# Altium footprint library LION.PcbLib: 90 footprints (part 9 of 13)
Each footprint in its own frame and in the unit in brackets; x right, y up, seen from the top. Pads: shape width x height; smd on the part's side, far side on the other; paste and mask are expansions set on the pad; w line width, h text height; cw(c..) or ccw(c..) is an arc to the next point about the centre after c.
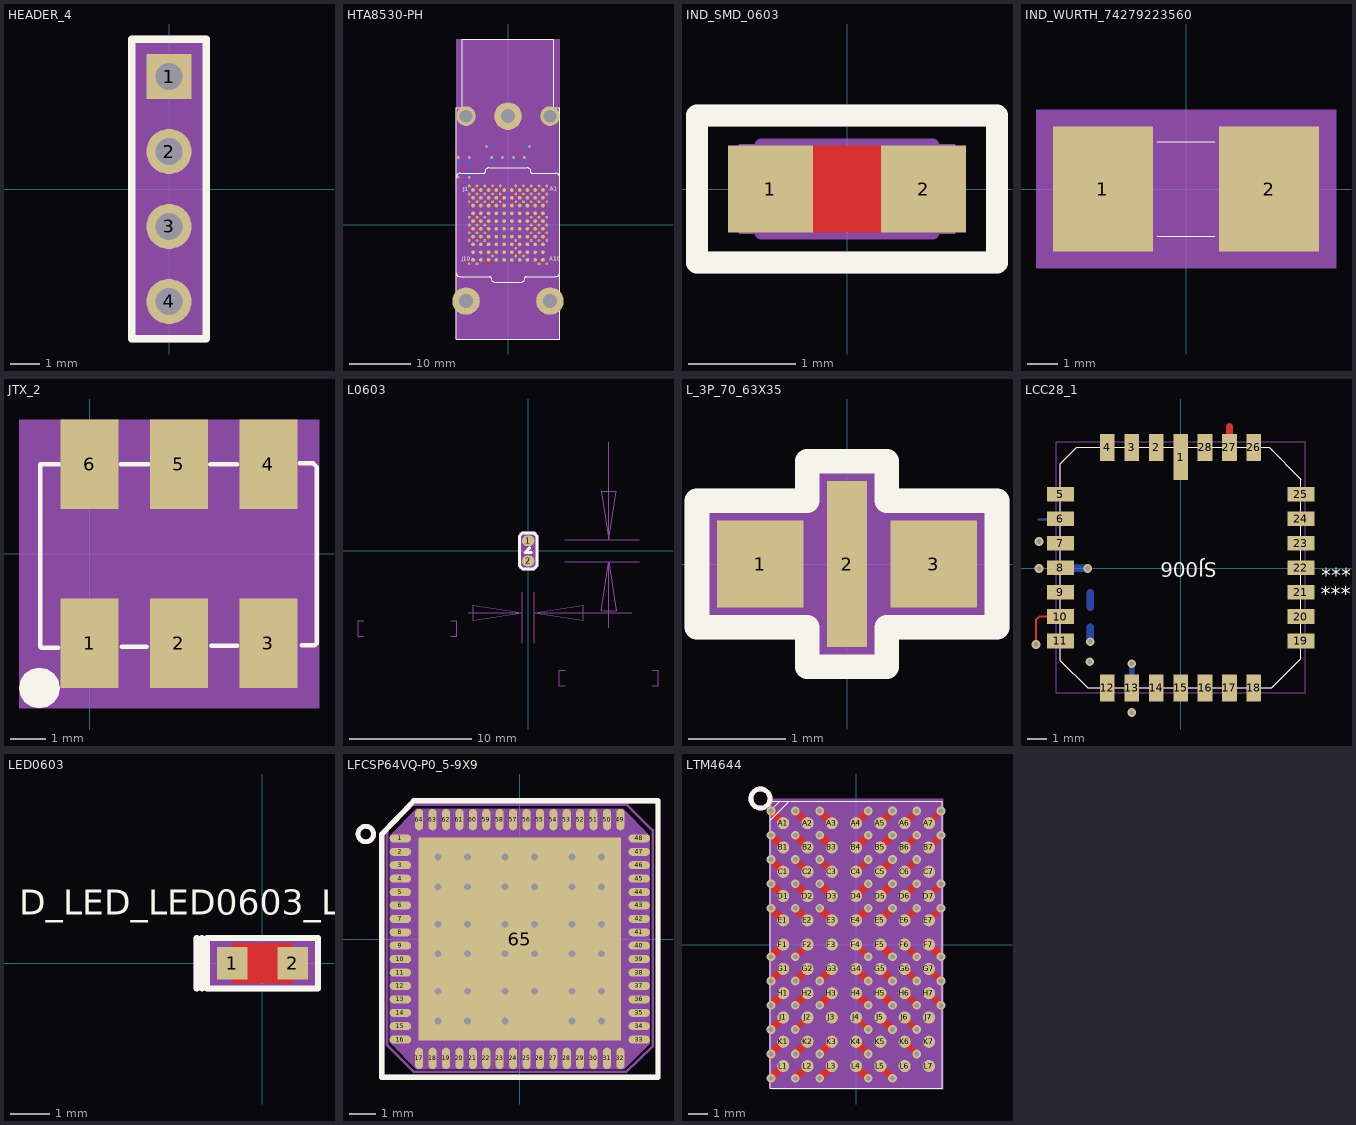
[diagram p8: the footprints below, top view; thin cyan lines are the x and y axes]

## HEADER_4 [mil] "HEADER_4"
pads (4):
  rect 60x60 / inner rect 55x55 / far side rect 60x60 hole 36: 1(0,150)
  round 60 / inner round 55 / far side round 60 hole 36: 2(0,50) 3(0,-50) 4(0,-150)
Top Overlay:
  lines w10: -50,-200 50,-200 50,200 -50,200 -50,-200
  text ".Designator" at 17.5,-265 h25
Mechanical 5:
  lines w10: -50,-200 50,-200 50,200 -50,200 -50,-200
  text "J9" at -20.83,-248.34 h25
Mechanical 14:
  text "2" at 0,42 h20
  text "1" at 0,142 h20
  text "3" at 0,-66 h20
  text "4" at 0,-166 h20
Mechanical 16:
  region: -50,200 -50,-200 50,-200 50,200
  lines w1: -50,-200 50,-200 50,200 -50,200 -50,-200
3D body: height 150, standoff 0, extent -50,-200 50,200

## HTA8530-PH [mm] "HTA8530-PH"
pads (105):
  round 4.5 hole 2.3: " "(-6.86,-12.445) " "(0,17.785) " "(6.86,-12.445)
  round 3.2 hole 2.1: " "(-6.86,17.785) " "(6.86,17.785)
  round 0.6 smd: A1(5.715,5.715) A2(5.715,4.445) A3(5.715,3.175) A4(5.715,1.905) A5(5.715,0.635) A6(5.715,-0.635) A7(5.715,-1.905) A8(5.715,-3.175) A9(5.715,-4.445) A10(5.715,-5.715) B1(4.445,5.715) B2(4.445,4.445) B3(4.445,3.175) B4(4.445,1.905) B5(4.445,0.635) B6(4.445,-0.635) B7(4.445,-1.905) B8(4.445,-3.175) B9(4.445,-4.445) B10(4.445,-5.715) C1(3.175,5.715) C2(3.175,4.445) C3(3.175,3.175) C4(3.175,1.905) C5(3.175,0.635) C6(3.175,-0.635) C7(3.175,-1.905) C8(3.175,-3.175) C9(3.175,-4.445) C10(3.175,-5.715) D1(1.905,5.715) D2(1.905,4.445) D3(1.905,3.175) D4(1.905,1.905) D5(1.905,0.635) D6(1.905,-0.635) D7(1.905,-1.905) D8(1.905,-3.175) D9(1.905,-4.445) D10(1.905,-5.715) E1(0.635,5.715) E2(0.635,4.445) E3(0.635,3.175) E4(0.635,1.905) E5(0.635,0.635) E6(0.635,-0.635) E7(0.635,-1.905) E8(0.635,-3.175) E9(0.635,-4.445) E10(0.635,-5.715) F1(-0.635,5.715) F2(-0.635,4.445) F3(-0.635,3.175) F4(-0.635,1.905) F5(-0.635,0.635) F6(-0.635,-0.635) F7(-0.635,-1.905) F8(-0.635,-3.175) F9(-0.635,-4.445) F10(-0.635,-5.715) G1(-1.905,5.715) G2(-1.905,4.445) G3(-1.905,3.175) G4(-1.905,1.905) G5(-1.905,0.635) G6(-1.905,-0.635) G7(-1.905,-1.905) G8(-1.905,-3.175) G9(-1.905,-4.445) G10(-1.905,-5.715) H1(-3.175,5.715) H2(-3.175,4.445) H3(-3.175,3.175) H4(-3.175,1.905) H5(-3.175,0.635) H6(-3.175,-0.635) H7(-3.175,-1.905) H8(-3.175,-3.175) H9(-3.175,-4.445) H10(-3.175,-5.715) I1(-4.445,5.715) I2(-4.445,4.445) I3(-4.445,3.175) I4(-4.445,1.905) I5(-4.445,0.635) I6(-4.445,-0.635) I7(-4.445,-1.905) I8(-4.445,-3.175) I9(-4.445,-4.445) I10(-4.445,-5.715) J1(-5.715,5.715) J2(-5.715,4.445) J3(-5.715,3.175) J4(-5.715,1.905) J5(-5.715,0.635) J6(-5.715,-0.635) J7(-5.715,-1.905) J8(-5.715,-3.175) J9(-5.715,-4.445) J10(-5.715,-5.715)
via 6.35,-2.54 diameter 0.457 hole 0.254
via 5.08,-2.54 diameter 0.457 hole 0.254
via 3.81,-2.54 diameter 0.457 hole 0.254
via 6.35,-6.35 diameter 0.457 hole 0.254
via 5.08,-6.35 diameter 0.457 hole 0.254
via 6.35,1.27 diameter 0.457 hole 0.254
via 1.27,-5.08 diameter 0.457 hole 0.254
via 3.81,0 diameter 0.457 hole 0.254
via -5.08,-2.54 diameter 0.457 hole 0.254
via -6.35,-2.54 diameter 0.457 hole 0.254
via -3.81,-2.54 diameter 0.457 hole 0.254
via 1.27,-3.81 diameter 0.457 hole 0.254
via 6.35,6.35 diameter 0.457 hole 0.254
via -5.08,-6.35 diameter 0.457 hole 0.254
via -6.35,-6.35 diameter 0.457 hole 0.254
via 3.81,5.08 diameter 0.457 hole 0.254
via 3.81,6.35 diameter 0.457 hole 0.254
via 6.35,5.08 diameter 0.457 hole 0.254
via -2.54,-5.08 diameter 0.457 hole 0.254
via 2.54,-5.08 diameter 0.457 hole 0.254
via 3.81,1.27 diameter 0.457 hole 0.254
via 1.27,-2.54 diameter 0.457 hole 0.254
via 6.35,0 diameter 0.457 hole 0.254
via -3.81,5.08 diameter 0.457 hole 0.254
via -6.35,5.08 diameter 0.457 hole 0.254
via -3.81,1.27 diameter 0.457 hole 0.254
via -6.35,6.35 diameter 0.457 hole 0.254
via -6.35,1.27 diameter 0.457 hole 0.254
via -6.35,0 diameter 0.457 hole 0.254
via -3.81,6.35 diameter 0.457 hole 0.254
via -3.81,0 diameter 0.457 hole 0.254
via -8.128,11.011 diameter 0.457 hole 0.254
via -6.35,11.011 diameter 0.457 hole 0.254
via -2.667,11.049 diameter 0.457 hole 0.254
via 0.889,11.011 diameter 0.457 hole 0.254
via -0.889,11.011 diameter 0.457 hole 0.254
via 2.667,11.049 diameter 0.457 hole 0.254
via 3.81,3.81 diameter 0.457 hole 0.254
via 5.08,3.81 diameter 0.457 hole 0.254
via 5.08,5.08 diameter 0.457 hole 0.254
via 5.08,6.35 diameter 0.457 hole 0.254
via 1.27,3.81 diameter 0.457 hole 0.254
via 1.27,5.08 diameter 0.457 hole 0.254
via 1.27,6.35 diameter 0.457 hole 0.254
via 2.54,3.81 diameter 0.457 hole 0.254
via 2.54,5.08 diameter 0.457 hole 0.254
via 2.54,6.35 diameter 0.457 hole 0.254
via 6.35,3.81 diameter 0.457 hole 0.254
via -5.08,6.35 diameter 0.457 hole 0.254
via -3.81,3.81 diameter 0.457 hole 0.254
via -2.54,3.81 diameter 0.457 hole 0.254
via -2.54,5.08 diameter 0.457 hole 0.254
via -2.54,6.35 diameter 0.457 hole 0.254
via -1.27,3.81 diameter 0.457 hole 0.254
via -1.27,5.08 diameter 0.457 hole 0.254
via -6.35,3.81 diameter 0.457 hole 0.254
via -5.08,3.81 diameter 0.457 hole 0.254
via -5.08,5.08 diameter 0.457 hole 0.254
via -1.27,6.35 diameter 0.457 hole 0.254
via -8.128,7.785 diameter 0.457 hole 0.254
via -6.35,7.785 diameter 0.457 hole 0.254
via 3.518,12.827 diameter 0.457 hole 0.254
via -3.518,12.827 diameter 0.457 hole 0.254
via -3.81,-1.27 diameter 0.457 hole 0.254
via -6.35,-1.27 diameter 0.457 hole 0.254
via -5.08,-1.27 diameter 0.457 hole 0.254
via -5.08,1.27 diameter 0.457 hole 0.254
via -5.08,0 diameter 0.457 hole 0.254
via 6.35,-1.27 diameter 0.457 hole 0.254
via 5.08,1.27 diameter 0.457 hole 0.254
via 5.08,0 diameter 0.457 hole 0.254
via 5.08,-1.27 diameter 0.457 hole 0.254
via 3.81,-1.27 diameter 0.457 hole 0.254
Top Layer:
  lines w0.127: -6.35,0 -5.715,0.635 ; -6.35,1.27 -5.715,1.905 ; -6.35,5.08 -5.715,4.445 ; -6.35,6.35 -5.715,5.715 ; -3.81,0 -3.175,0.635 ; -3.81,1.27 -3.175,1.905 ; -3.81,5.08 -3.175,4.445 ; -3.81,6.35 -3.175,5.715 ; 3.175,0.635 3.81,0 ; 3.175,1.905 3.81,1.27 ; 3.175,4.445 3.81,5.08 ; 3.175,5.715 3.81,6.35 ; 5.715,0.635 6.35,0 ; 5.715,1.905 6.35,1.27 ; 5.715,4.445 6.35,5.08 ; 5.715,5.715 6.35,6.35
  lines w0.254: -6.35,-6.35 -5.715,-5.715 ; -6.35,-2.54 -5.715,-1.905 ; -5.08,-6.35 -4.445,-5.715 ; -5.08,-2.54 -4.445,-1.905 ; -3.81,-2.54 -3.175,-1.905 ; -2.54,-5.08 -1.905,-4.445 ; 0.635,-4.445 1.27,-5.08 ; 0.635,-3.175 1.27,-3.81 ; 1.27,-2.54 1.905,-3.175 ; 1.905,-4.445 2.54,-5.08
  lines w0.381: -6.35,-1.27 -5.715,-0.635 ; -6.35,3.81 -5.715,3.175 ; -5.08,-1.27 -4.445,-0.635 ; -5.08,0 -4.445,0.635 ; -5.08,1.27 -4.445,1.905 ; -5.08,3.81 -4.445,3.175 ; -5.08,5.08 -4.445,4.445 ; -5.08,6.35 -4.445,5.715 ; -3.81,-1.27 -3.175,-0.635 ; -3.81,3.81 -3.175,3.175 ; -3.465,-6.508 -3.175,-6.218 -3.175,-5.715 ; -2.54,3.81 -1.905,3.175 ; -2.54,5.08 -1.905,4.445 ; -2.54,6.35 -1.905,5.715 ; -1.27,3.81 -0.635,3.175 ; -1.27,5.08 -0.635,4.445 ; -1.27,6.35 -0.635,5.715 ; 0.635,3.175 1.27,3.81 ; 0.635,4.445 1.27,5.08 ; 0.635,5.715 1.27,6.35 ; 1.905,3.175 2.54,3.81 ; 1.905,4.445 2.54,5.08 ; 1.905,5.715 2.54,6.35 ; 3.175,-1.905 3.81,-2.54 ; 3.175,-0.635 3.81,-1.27 ; 3.175,3.175 3.81,3.81 ; 4.445,-5.715 5.08,-6.35 ; 4.445,-0.635 5.08,-1.27 ; 4.445,0.635 5.08,0 ; 4.445,1.905 5.08,1.27 ; 4.445,3.175 5.08,3.81 ; 4.445,4.445 5.08,5.08 ; 4.445,5.715 5.08,6.35 ; 5.715,-5.715 6.35,-6.35 ; 5.715,-1.905 6.35,-2.54 ; 5.715,-0.635 6.35,-1.27 ; 5.715,3.175 6.35,3.81
Bottom Layer:
  lines w0.381: -8.128,7.785 -8.128,8.572 ; -8.128,10.223 -8.128,11.011 ; -6.35,7.785 -6.35,8.572 ; -6.35,10.223 -6.35,11.011 ; -3.518,12.827 -2.73,12.827 ; -2.667,10.223 -2.667,11.049 ; -0.889,10.223 -0.889,11.011 ; 0.889,10.223 0.889,11.011 ; 2.667,10.223 2.667,11.049 ; 2.73,12.827 3.518,12.827
Top Overlay:
  lines w0.025: -8.5,-18.645 -8.5,19.205 -7.5,19.205 -7.5,30.405 7.5,30.405 7.5,19.205 8.5,19.205 8.5,-18.645 -8.5,-18.645 ; -8.45,-7.815 ccw(c-7.815,-7.815) -7.815,-8.45 -2.95,-8.45 cw(c-2.95,-8.65) -2.75,-8.65 -2.75,-8.715 ccw(c-2.115,-8.715) -2.115,-9.35 2.115,-9.35 ccw(c2.115,-8.715) 2.75,-8.715 2.75,-8.65 cw(c2.95,-8.65) 2.95,-8.45 7.815,-8.45 ccw(c7.815,-7.815) 8.45,-7.815 8.45,7.815 ccw(c7.815,7.815) 7.815,8.45 3.95,8.45 cw(c3.95,8.65) 3.75,8.65 3.75,8.715 ccw(c3.115,8.715) 3.115,9.35 -3.115,9.35 ccw(c-3.115,8.715) -3.75,8.715 -3.75,8.65 cw(c-3.95,8.65) -3.95,8.45 -7.815,8.45 ccw(c-7.815,7.815) -8.45,7.815 -8.45,-7.815
  text "J10" at -7.54,-5.89 h0.64
  text "A10" at 6.77,-5.86 h0.64
  text "J1" at -7.29,5.52 h0.64
  text "A1" at 6.8,5.61 h0.64
Mechanical 5:
  lines w0.025: -8.5,-13.985 -8.5,-18.645 8.5,-18.645 8.5,-13.985 ; -8.5,-10.905 -8.5,19.205 -7.597,19.205 ; -7.5,19.251 -7.5,30.405 7.5,30.405 7.5,19.251 ; 7.597,19.205 8.5,19.205 8.5,-10.905 ; -8.45,-7.815 ccw(c-7.815,-7.815) -7.815,-8.45 -2.95,-8.45 cw(c-2.95,-8.65) -2.75,-8.65 -2.75,-8.715 ccw(c-2.115,-8.715) -2.115,-9.35 2.115,-9.35 ccw(c2.115,-8.715) 2.75,-8.715 2.75,-8.65 cw(c2.95,-8.65) 2.95,-8.45 7.815,-8.45 ccw(c7.815,-7.815) 8.45,-7.815 8.45,7.815 ccw(c7.815,7.815) 7.815,8.45 3.95,8.45 cw(c3.95,8.65) 3.75,8.65 3.75,8.715 ccw(c3.115,8.715) 3.115,9.35 -3.115,9.35 ccw(c-3.115,8.715) -3.75,8.715 -3.75,8.65 cw(c-3.95,8.65) -3.95,8.45 -7.815,8.45 ccw(c-7.815,7.815) -8.45,7.815 -8.45,-7.815
  text "U90" at 8.764,0.441 h0.64
  text "A1" at 7.223,6.457 h0.64
  text "J1" at -7.29,5.52 h0.64
  text "A10" at 7.511,-4.695 h0.64
  text "J10" at -6.799,-4.725 h0.64
Mechanical 14:
  text "E10" at 0.635,-4.953 h0.64
  text "A8" at 5.715,-2.667 h0.64
  text "D7" at 1.905,-1.397 h0.64
  text "D10" at 1.905,-4.953 h0.64
  text "E4" at 0.635,2.413 h0.64
  text "E5" at 0.635,1.143 h0.64
  text "E6" at 0.635,-0.127 h0.64
  text "E7" at 0.635,-1.397 h0.64
  text "F4" at -0.635,2.413 h0.64
  text "F5" at -0.635,1.143 h0.64
  text "F6" at -0.635,-0.127 h0.64
  text "F7" at -0.635,-1.397 h0.64
  text "A9" at 5.715,-3.937 h0.64
  text "F8" at -0.635,-2.667 h0.64
  text "F9" at -0.635,-3.937 h0.64
  text "F10" at -0.635,-4.953 h0.64
  text "G4" at -1.905,2.413 h0.64
  text "G5" at -1.905,1.143 h0.64
  text "G6" at -1.905,-0.127 h0.64
  text "G7" at -1.905,-1.397 h0.64
  text "G10" at -1.905,-4.953 h0.64
  text "J8" at -5.715,-2.667 h0.64
  text "B8" at 4.445,-2.667 h0.64
  text "J9" at -5.715,-3.937 h0.64
  text "B9" at 4.445,-3.937 h0.64
  text "C8" at 3.175,-2.667 h0.64
  text "C9" at 3.175,-3.937 h0.64
  text "D4" at 1.905,2.413 h0.64
  text "D5" at 1.905,1.143 h0.64
  text "D6" at 1.905,-0.127 h0.64
  text "G8" at -1.905,-2.667 h0.64
  text "H8" at -3.175,-2.667 h0.64
  text "I8" at -4.445,-2.667 h0.64
  text "I9" at -4.445,-3.937 h0.64
  text "H9" at -3.175,-3.937 h0.64
  text "A7" at 5.715,-1.397 h0.64
  text "B7" at 4.445,-1.397 h0.64
  text "C7" at 3.175,-1.397 h0.64
  text "A10" at 5.715,-4.953 h0.64
  text "B10" at 4.445,-4.953 h0.64
  text "A4" at 5.715,2.413 h0.64
  text "E9" at 0.635,-3.937 h0.64
  text "C5" at 3.175,1.143 h0.64
  text "I7" at -4.445,-1.397 h0.64
  text "J7" at -5.715,-1.397 h0.64
  text "H7" at -3.175,-1.397 h0.64
  text "E8" at 0.635,-2.667 h0.64
  text "A1" at 5.715,6.223 h0.64
  text "I10" at -4.445,-4.953 h0.64
  text "J10" at -5.715,-4.953 h0.64
  text "C2" at 3.175,4.953 h0.64
  text "C1" at 3.175,6.223 h0.64
  text "A2" at 5.715,4.953 h0.64
  text "G9" at -1.905,-3.937 h0.64
  text "D9" at 1.905,-3.937 h0.64
  text "C4" at 3.175,2.413 h0.64
  text "D8" at 1.905,-2.667 h0.64
  text "A5" at 5.715,1.143 h0.64
  text "H2" at -3.175,4.953 h0.64
  text "J2" at -5.715,4.953 h0.64
  text "H4" at -3.175,2.413 h0.64
  text "J1" at -5.715,6.223 h0.64
  text "J4" at -5.715,2.413 h0.64
  text "J5" at -5.715,1.143 h0.64
  text "H1" at -3.175,6.223 h0.64
  text "H5" at -3.175,1.143 h0.64
  text "C3" at 3.175,3.683 h0.64
  text "B3" at 4.445,3.683 h0.64
  text "B2" at 4.445,4.953 h0.64
  text "B1" at 4.445,6.223 h0.64
  text "E3" at 0.635,3.683 h0.64
  text "E2" at 0.635,4.953 h0.64
  text "E1" at 0.635,6.223 h0.64
  text "D3" at 1.905,3.683 h0.64
  text "D2" at 1.905,4.953 h0.64
  text "D1" at 1.905,6.223 h0.64
  text "A3" at 5.715,3.683 h0.64
  text "I1" at -4.445,6.223 h0.64
  text "H3" at -3.175,3.683 h0.64
  text "G3" at -1.905,3.683 h0.64
  text "G2" at -1.905,4.953 h0.64
  text "G1" at -1.905,6.223 h0.64
  text "F3" at -0.635,3.683 h0.64
  text "F2" at -0.635,4.953 h0.64
  text "J3" at -5.715,3.683 h0.64
  text "I3" at -4.445,3.683 h0.64
  text "I2" at -4.445,4.953 h0.64
  text "F1" at -0.635,6.223 h0.64
  text "H6" at -3.175,-0.127 h0.64
  text "J6" at -5.715,-0.127 h0.64
  text "I6" at -4.445,-0.127 h0.64
  text "I4" at -4.445,2.413 h0.64
  text "I5" at -4.445,1.143 h0.64
  text "H10" at -3.175,-4.953 h0.64
  text "C10" at 3.175,-4.953 h0.64
  text "A6" at 5.715,-0.127 h0.64
  text "B4" at 4.445,2.413 h0.64
  text "B5" at 4.445,1.143 h0.64
  text "B6" at 4.445,-0.127 h0.64
  text "C6" at 3.175,-0.127 h0.64
Mechanical 16:
  pour cut-out: -8.49,30.4 -8.49,-18.645 8.5,-18.645 8.5,30.4
  region: -8.49,30.4 -8.49,-18.645 8.5,-18.645 8.5,30.4
Mechanical 17:
  text ".Designator" at 0.005,6.216 h0.64
  text "84512-102LF" at -0.04,-5.096 h0.64
3D body: height 3.81, standoff 0, extent -8.49,-18.645 8.5,30.4

## IND_SMD_0603 [mm] "IND_SMD_0603"
pads (2):
  rect 0.79x0.81 smd: 1(-0.713,0) 2(0.713,0)
Top Layer:
  region: -0.318,0.405 0.318,0.405 0.318,-0.405 -0.318,-0.405
Top Overlay:
  lines w0.203: -1.397,-0.686 1.397,-0.686 1.397,0.686 -1.397,0.686 -1.397,-0.686
  text ".Designator" at 1.269,-1.075 h0.64
Mechanical 5:
  lines w0.203: -1.397,-0.686 1.397,-0.686 1.397,0.686 -1.397,0.686 -1.397,-0.686
  text "LB1" at 1.269,-1.075 h0.64
Mechanical 14:
  text "1" at -0.713,-0.203 h0.25
  text "2" at 0.713,-0.203 h0.25
Mechanical 16:
  region: -0.737,-0.356 0.737,-0.356 0.737,0.356 -0.737,0.356
  lines w0.025: -1,-0.405 -0.35,-0.405 -0.35,0.405 -1,0.405 -1,-0.405 ; -0.8,-0.405 0.8,-0.405 0.8,0.405 -0.8,0.405 -0.8,-0.405 ; -0.737,-0.356 0.737,-0.356 0.737,0.356 -0.737,0.356 -0.737,-0.356 ; -0.725,0 cw(c-0.675,0) -0.625,0 cw(c-0.675,0) -0.725,0 ; 0.35,-0.405 1,-0.405 1,0.405 0.35,0.405 0.35,-0.405 ; 0.625,0 cw(c0.675,0) 0.725,0 cw(c0.675,0) 0.625,0
  lines w0.127: -0.8,-0.405 -0.8,0.405 0.8,0.405 0.8,-0.405 -0.8,-0.405
3D body: height 3.81, standoff 0, extent -0.737,-0.356 0.737,0.356

## IND_WURTH_74279223560 [mil] "IND_WURTH_74279223560"
pads (2):
  rect 128x160 smd: 1(-105.91,0) 2(105.91,0)
Top Overlay:
  lines w1: -36.42,-60.04 36.42,-60.04 ; -36.42,60.04 36.42,60.04
  text ".Designator" at 40,-97.5 h25
Mechanical 5:
  lines w1: -36.42,-60.04 36.42,-60.04 ; -36.42,60.04 36.42,60.04
  text "L14" at 40,-97.5 h25
Mechanical 14:
  text "1" at -65.91,0 h50
  text "2" at 145.91,0 h50
Mechanical 16:
  region: -191.34,100.79 191.34,100.79 191.34,-100.79 -191.34,-100.79
  lines w1: -79.92,-60.04 79.92,-60.04 79.92,60.04 -79.92,60.04 -79.92,-60.04
Mechanical 25:
  text "BUILT BY: P. SERINO" at 65,-450 h25
  text "MAX HT= 2.3mm/.091" at 51.69,-271.3 h25
  text "DIMENSIONING IN mm; SCALE=NONE" at 171.69,-330.35 h25
  text "LAST CHANGE DATE:  21-Aug-2013" at 171.69,-389.41 h25
  text "PAD: SMT128x160" at 200,-225 h50
3D body: height 150, standoff 0, extent -191.34,-100.79 191.34,100.79

## JTX_2 [mm] "JTX_2"
pads (6):
  rect 1.65x2.54 smd: 1(0,-2.54) 2(2.54,-2.54) 3(5.08,-2.54) 4(5.08,2.54) 5(2.54,2.54) 6(0,2.54)
Top Overlay:
  pour cut-out: -1.422,-3.231 -1.644,-3.275 -1.832,-3.401 -1.957,-3.588 -2.001,-3.81 -1.957,-4.032 -1.832,-4.219 -1.644,-4.345 -1.422,-4.389 -1.201,-4.345 -1.013,-4.219 -0.887,-4.032 -0.843,-3.81 -0.887,-3.588 -1.013,-3.401 -1.201,-3.275
  lines w0.127: -0.889,-2.667 -1.372,-2.667 -1.397,-2.642 -1.397,2.54 -0.864,2.54 ; 0.889,2.54 1.676,2.54 ; 0.914,-2.642 1.626,-2.642 ; 3.429,2.54 4.191,2.54 ; 3.454,-2.616 4.191,-2.616 ; 5.969,2.565 6.35,2.565 6.452,2.464 6.452,-2.54 6.401,-2.591 6.02,-2.591
Mechanical 5:
  lines w0.127: -0.889,-2.667 -1.372,-2.667 -1.397,-2.642 -1.397,2.54 -0.888,2.54 ; 0.889,2.54 1.652,2.54 ; 0.914,-2.642 1.626,-2.642 ; 3.429,2.54 4.191,2.54 ; 3.454,-2.616 4.191,-2.616 ; 5.969,2.565 6.35,2.565 6.452,2.464 6.452,-2.54 6.401,-2.591 6.02,-2.591
  text "T15" at 7.733,-0.961 h0.64
Mechanical 14:
  text "2" at 2.54,-3.048 h0.64
  text "3" at 5.08,-3.048 h0.64
  text "4" at 5.08,2.032 h0.64
  text "6" at 0,2.032 h0.64
  text "5" at 2.54,2.032 h0.64
  text "1" at 0,-3.048 h0.64
Mechanical 16:
  region: -1.99,-4.378 6.515,-4.378 6.515,3.81 -1.99,3.81
3D body: height 3.81, standoff 0, extent -1.99,-4.378 6.515,3.81

## L0603 [mil] "L0603"
pads (2):
  oval 40x35 smd: 1(0,32.5) 2(0,-32.5)
Top Overlay:
  lines w10: 5,10 -10,-5 10,-5 ; -28,-48 -28,48 -18,58 18,58 28,48 28,-48 18,-58 -18,-58 -28,-48
Mechanical 5:
  lines w10: -25,-51.01 -28,-48 -28,48 -25,51.01 ; -21,-54.99 -18,-58 18,-58 21,-54.99 ; -21,54.99 -18,58 18,58 21,54.99 ; 5,10 -10,-5 10,-5 ; 25,-51.01 28,-48 28,48 25,51.01
  text "FB11" at 55.83,99.95 h25
Mechanical 13:
  lines w1: -530,-275 -549,-275 -549,-225 -530,-225 ; -250,-275 -231,-275 -231,-225 -250,-225 ; -193.5,-200 -19.7,-200 ; -19.7,-298.4 -19.7,-133.9 ; 19.7,-298.4 19.7,-133.9 ; 118.1,-35.4 358.4,-35.4 ; 118.1,35.4 358.4,35.4 ; 120,-435 101,-435 101,-385 120,-385 ; 260,-247.5 260,-35.4 ; 260,350.4 260,35.4 ; 334.6,-200 19.7,-200 ; 400,-435 419,-435 419,-385 400,-385 ; -19.7,-200 -177.2,-224.6 -177.2,-175.4 -19.7,-200 ; 19.7,-200 177.2,-175.4 177.2,-224.6 19.7,-200 ; 260,-35.4 284.6,-192.9 235.4,-192.9 260,-35.4 ; 260,35.4 235.4,192.9 284.6,192.9 260,35.4
  text "39.36" at -511,-275 h36
  text "1" at -409,-175 h36
  text "70.86" at 139,-435 h36
  text "1.8" at 190,-335 h36
Mechanical 14:
  text "1" at 11.2,32.5 h28
  text "2" at 11.2,-32.5 h28
Mechanical 16:
  pour cut-out: -28,-58 28,-58 28,58 -28,58
  region: -19.7,-35.4 19.7,-35.4 19.7,35.4 -19.7,35.4
  lines w1: -19.7,-35.4 -19.7,35.4 19.7,35.4 19.7,-35.4 -19.7,-35.4
Mechanical 17:
  text ".Designator" at 57.6,12 h36
3D body: height 150, standoff 0, extent -19.7,-35.4 19.7,35.4

## L_3P_70_63X35 [mil] "L_3P_70_63X35"
pads (3):
  rect 35x35 smd: 1(-35.04,0) 3(35.04,0)
  rect 16x67 smd: 2(0,0)
Top Overlay:
  lines w10: -60.54,-25.5 -16,-25.5 -16,-41.5 16,-41.5 16,-25.5 60.54,-25.5 60.54,25.5 16,25.5 16,41.5 -16,41.5 -16,25.5 -60.54,25.5 -60.54,-25.5
  text ".Designator" at 102.5,-24.99 h25
Mechanical 5:
  lines w10: -60.54,-25.5 -60.54,25.5 -16,25.5 -16,41.5 16,41.5 16,25.5 60.54,25.5 60.54,-25.5 16,-25.5 16,-41.5 -16,-41.5 -16,-25.5 -60.54,-25.5
  text "B4" at 94.17,-38.34 h25
Mechanical 14:
  text "3" at 35.04,-11.2 h28
  text "1" at -35.04,-11.2 h28
  text "2" at 0,-11.2 h28
Mechanical 16:
  pour cut-out: -16,25.5 -16,41.5 16,41.5 16,25.5 60.54,25.5 60.54,-25.5 16,-25.5 16,-41.5 -16,-41.5 -16,-25.5 -60.54,-25.5 -60.54,25.5
  region: -31.5,-15.75 31.5,-15.75 31.5,15.75 -31.5,15.75
  lines w1: -31.5,-15.75 31.5,-15.75 31.5,15.75 -31.5,15.75 -31.5,-15.75
3D body: height 150, standoff 0, extent -31.5,-15.75 31.5,15.75

## LCC28_1 [mil] "LCC28_1"
pads (28):
  rect 30x94 smd: 1(0,227.52)
  rect 30x55 smd: 2(-50,247.52) 3(-100,247.52) 4(-150,247.52) 12(-150,-244.6) 13(-100,-244.6) 14(-50,-244.6) 15(0,-244.6) 16(50,-244.6) 17(100,-244.6) 18(150,-244.6) 26(150,247.52) 27(100,247.52) 28(50,247.52)
  rect 55x30 smd: 5(-246.06,151.46) 6(-246.06,101.46) 7(-246.06,51.46) 8(-246.06,1.46) 9(-246.06,-48.54) 10(-246.06,-98.54) 11(-246.06,-148.54) 19(246.06,-148.54) 20(246.06,-98.54) 21(246.06,-48.54) 22(246.06,1.46) 23(246.06,51.46) 24(246.06,101.46) 25(246.06,151.46)
via -186,-191 diameter 18 hole 10
via -290,0 diameter 18 hole 10
via -100,-295 diameter 18 hole 10
via -290,55 diameter 18 hole 10
via -296,-156 diameter 18 hole 10
via -190,0 diameter 18 hole 10
via -100,-195 diameter 18 hole 10
via -185,-150 diameter 18 hole 10
Top Layer:
  lines w4: -296,-156 -296,-105.4 -289.14,-98.54 -246.06,-98.54
  lines w15: 100,247.52 100,290.02
Bottom Layer:
  lines w5: -290,100 -260,100
  lines w12: -100,-225 -100,-195
  lines w15: -220,0 -190,0 ; -185,-150 -185,-120 ; -185,-80 -185,-50
Top Overlay:
  lines w1: -129.45,247.52 181.34,247.52 246.06,182.8 246.06,145.55 246.06,-185.28 186.74,-244.6 175.08,-244.6 ; -129.21,247.52 -212.6,247.52 -246.06,214.06 -246.06,-188.58 -190.12,-244.53 -190.04,-244.6 175.08,-244.6 ; 175.08,-244.61 175.08,-244.6
  text "***" at 287,-67 h30
  text "***" at 288,-29 h30
  text "SJ006" at 73.5,12.34 h30
Mechanical 5:
  lines w1: -246.06,-163.54 -246.06,-188.58 -190.12,-244.53 -190.04,-244.6 -165,-244.6 ; -246.06,-133.54 -246.06,-113.54 ; -246.06,-83.54 -246.06,-63.54 ; -246.06,-33.54 -246.06,-13.54 ; -246.06,16.46 -246.06,36.46 ; -246.06,66.46 -246.06,86.46 ; -246.06,116.46 -246.06,136.46 ; -246.06,166.46 -246.06,214.06 -212.6,247.52 -165,247.52 ; -135,-244.6 -115,-244.6 ; -135,247.52 -129.21,247.52 ; -129.45,247.52 -115,247.52 ; -85,-244.6 -65,-244.6 ; -85,247.52 -65,247.52 ; -35,-244.6 -15,-244.6 ; -35,247.52 -15,247.52 ; 15,-244.6 35,-244.6 ; 15,247.52 35,247.52 ; 65,-244.6 85,-244.6 ; 65,247.52 85,247.52 ; 115,-244.6 135,-244.6 ; 115,247.52 135,247.52 ; 165,-244.6 175.08,-244.6 ; 165,247.52 181.34,247.52 246.06,182.8 246.06,166.46 ; 246.06,-163.54 246.06,-185.28 186.74,-244.6 175.08,-244.6 ; 246.06,-133.54 246.06,-113.54 ; 246.06,-83.54 246.06,-63.54 ; 246.06,-33.54 246.06,-13.54 ; 246.06,16.46 246.06,36.46 ; 246.06,66.46 246.06,86.46 ; 246.06,116.46 246.06,136.46 ; 175.08,-244.61 175.08,-244.6
  text "U53" at -28.51,306.5 h25
  text "SW128_2_LCC28_1_SJ006" at 286,43 h30
  text "SJ006" at 73.5,12.34 h30
  text "***" at 358,41 h30
  text "***" at 348,-56 h30
Mechanical 14:
  text "17" at 60,-244.6 h25
  text "19" at 206.06,-148.54 h25
  text "18" at 110,-244.6 h25
  text "21" at 206.06,-48.54 h25
  text "20" at 206.06,-98.54 h25
  text "3" at -120,247.52 h25
  text "22" at 206.06,1.46 h25
  text "24" at 206.06,101.46 h25
  text "23" at 206.06,51.46 h25
  text "26" at 110,247.52 h25
  text "25" at 206.06,151.46 h25
  text "4" at -170,247.52 h25
  text "11" at -286.06,-148.54 h25
  text "6" at -266.06,101.46 h25
  text "8" at -266.06,1.46 h25
  text "13" at -140,-244.6 h25
  text "14" at -90,-244.6 h25
  text "9" at -266.06,-48.54 h25
  text "2" at -70,247.52 h25
  text "1" at -20,227.52 h25
  text "5" at -266.06,151.46 h25
  text "7" at -266.06,51.46 h25
  text "10" at -286.06,-98.54 h25
  text "12" at -190,-244.6 h25
  text "16" at 10,-244.6 h25
  text "28" at 10,247.52 h25
  text "15" at -40,-244.6 h25
  text "27" at 60,247.52 h25
Mechanical 16:
  lines w1: -255,-255 255,-255 255,259 -255,259 -255,-255
Mechanical 17:
  text "***" at -50,-110 h30
  text "***" at -50,-80 h30
  text "SJ006" at -50,-50 h30
  text "SW128_2_LCC28_1_SJ006" at -50,-20 h30
  text ".Designator" at 42.5,12.34 h30

## LED0603 [mil] "LED0603"
pads (2):
  rect 30x32 smd: 1(-30,0) 2(30,0)
Top Layer:
  region: -10,-20 -10,20 10,20 10,-20
  region: -30,-20 -30,20 30,20 30,-20
Top Overlay:
  lines w6: -65,-25 -65,25 ; -60,-25 -60,25 ; -55,-25 55,-25 55,25 -55,25 -55,-25
  text "D_LED_LED0603_LED_GREEN" at -241,48 h25
  text ".Designator" at -70.01,-108.5 h25
Mechanical 5:
  lines w6: -65,-25 -65,25 ; -60,-25 -60,25 ; -55,-25 55,-25 55,25 -55,25 -55,-25
  text "LED4" at -70.01,-108.5 h25
  text "D_LED_LED0603_LED_GREEN" at -241,48 h25
Mechanical 14:
  text "2" at 30,4 h10
  text "1" at -30,4 h10
Mechanical 16:
  region: -56,-25 -56,27 56,27 56,-25
  lines w6: -65,-25 -65,25 ; -60,-25 -60,25 ; -55,-25 55,-25 55,25 -55,25 -55,-25
Mechanical 17:
  text "LED_GREEN" at 100,0 h25
3D body: height 150, standoff 0, extent -56,-25 56,27

## LFCSP64VQ-P0_5-9X9 [mil] "LFCSP64VQ-P0_5-9X9"
pads (65):
  oval 31.5x11.81 smd: 1(-175.2,147.64) 2(-175.2,127.95) 3(-175.2,108.27) 4(-175.2,88.58) 5(-175.2,68.9) 6(-175.2,49.21) 7(-175.2,29.53) 8(-175.2,9.84) 9(-175.2,-9.84) 10(-175.2,-29.53) 11(-175.2,-49.21) 12(-175.2,-68.9) 13(-175.2,-88.58) 14(-175.2,-108.27) 15(-175.2,-127.95) 16(-175.2,-147.64) 33(175.2,-147.64) 34(175.2,-127.95) 35(175.2,-108.27) 36(175.2,-88.58) 37(175.2,-68.9) 38(175.2,-49.21) 39(175.2,-29.53) 40(175.2,-9.84) 41(175.2,9.84) 42(175.2,29.53) 43(175.2,49.21) 44(175.2,68.9) 45(175.2,88.58) 46(175.2,108.27) 47(175.2,127.95) 48(175.2,147.64)
  oval 11.81x31.5 smd: 17(-147.64,-175.2) 18(-127.95,-175.2) 19(-108.27,-175.2) 20(-88.58,-175.2) 21(-68.9,-175.2) 22(-49.21,-175.2) 23(-29.53,-175.2) 24(-9.84,-175.2) 25(9.84,-175.2) 26(29.53,-175.2) 27(49.21,-175.2) 28(68.9,-175.2) 29(88.58,-175.2) 30(108.27,-175.2) 31(127.95,-175.2) 32(147.64,-175.2) 49(147.64,175.2) 50(127.95,175.2) 51(108.27,175.2) 52(88.58,175.2) 53(68.9,175.2) 54(49.21,175.2) 55(29.53,175.2) 56(9.84,175.2) 57(-9.84,175.2) 58(-29.53,175.2) 59(-49.21,175.2) 60(-68.9,175.2) 61(-88.58,175.2) 62(-108.27,175.2) 63(-127.95,175.2) 64(-147.64,175.2)
  rect 297.24x297.24 smd: 65(0,0)
via 120.08,-120.08 diameter 18 hole 10
via 120.08,-76.77 diameter 18 hole 10
via 76.77,-120.08 diameter 18 hole 10
via 76.77,-76.77 diameter 18 hole 10
via 21.65,-76.77 diameter 18 hole 10
via -21.65,-120.08 diameter 18 hole 10
via -21.65,-76.77 diameter 18 hole 10
via -76.77,-120.08 diameter 18 hole 10
via -76.77,-76.77 diameter 18 hole 10
via -120.08,-120.08 diameter 18 hole 10
via -120.08,-76.77 diameter 18 hole 10
via -76.77,-21.65 diameter 18 hole 10
via -76.77,21.65 diameter 18 hole 10
via -120.08,-21.65 diameter 18 hole 10
via -120.08,21.65 diameter 18 hole 10
via -76.77,76.77 diameter 18 hole 10
via -76.77,120.08 diameter 18 hole 10
via -120.08,76.77 diameter 18 hole 10
via -120.08,120.08 diameter 18 hole 10
via 21.65,76.77 diameter 18 hole 10
via 21.65,120.08 diameter 18 hole 10
via -21.65,76.77 diameter 18 hole 10
via -21.65,120.08 diameter 18 hole 10
via 120.08,76.77 diameter 18 hole 10
via 120.08,120.08 diameter 18 hole 10
via 76.77,76.77 diameter 18 hole 10
via 76.77,120.08 diameter 18 hole 10
via 120.08,-21.65 diameter 18 hole 10
via 120.08,21.65 diameter 18 hole 10
via 76.77,-21.65 diameter 18 hole 10
via 76.77,21.65 diameter 18 hole 10
via -21.65,-21.65 diameter 18 hole 10
via 21.65,21.65 diameter 18 hole 10
via 21.65,-21.65 diameter 18 hole 10
via -21.65,21.65 diameter 18 hole 10
Top Overlay:
  circle w7: c-226,154 r11.4
  lines w7.87: -202.76,-202.76 202.76,-202.76 202.76,202.76 -155.51,202.76 -202.76,153.54 -202.76,-155.51 -202.76,-202.76
  text ".Designator" at -35,215 h25
Top Paste:
  pour cut-out: -39.37,39.37 -39.37,-39.37 39.37,-39.37 39.37,39.37
  pour cut-out: -39.37,137.8 -39.37,59.06 39.37,59.06 39.37,137.8
  pour cut-out: 59.06,137.8 59.06,59.06 137.8,59.06 137.8,137.8
  pour cut-out: 59.06,39.37 59.06,-39.37 137.8,-39.37 137.8,39.37
  pour cut-out: 59.06,-59.06 59.06,-137.8 137.8,-137.8 137.8,-59.06
  pour cut-out: -39.37,-59.06 -39.37,-137.8 39.37,-137.8 39.37,-59.06
  pour cut-out: -137.8,-59.06 -137.8,-137.8 -59.06,-137.8 -59.06,-59.06
  pour cut-out: -137.8,39.37 -137.8,-39.37 -59.06,-39.37 -59.06,39.37
  pour cut-out: -137.8,137.8 -137.8,59.06 -59.06,59.06 -59.06,137.8
Mechanical 5:
  lines w7: -237.4,154 ccw(c-226,154) -226,142.6 ccw(c-226,154) -214.6,154 ccw(c-226,154) -226,165.4 ccw(c-226,154) -237.4,154
  lines w7.87: -202.76,-202.76 202.76,-202.76 202.76,202.76 -155.51,202.76 -202.76,153.54 -202.76,-155.51 -202.76,-202.76
  text "U122" at -35,215 h25
Mechanical 14:
  text "39" at 167.2,-29.53 h10
  text "10" at -183.2,-29.53 h10
  text "9" at -179.2,-9.84 h10
  text "8" at -179.2,9.84 h10
  text "45" at 167.2,88.58 h10
  text "42" at 167.2,29.53 h10
  text "43" at 167.2,49.21 h10
  text "62" at -116.27,175.2 h10
  text "61" at -96.58,175.2 h10
  text "7" at -179.2,29.53 h10
  text "2" at -179.2,127.95 h10
  text "49" at 139.64,175.2 h10
  text "47" at 167.2,127.95 h10
  text "60" at -76.9,175.2 h10
  text "64" at -155.64,175.2 h10
  text "65" at -16,0 h10
  text "12" at -183.2,-68.9 h10
  text "15" at -183.2,-127.95 h10
  text "20" at -96.58,-175.2 h10
  text "23" at -37.53,-175.2 h10
  text "28" at 60.9,-175.2 h10
  text "26" at 21.53,-175.2 h10
  text "19" at -116.27,-175.2 h10
  text "37" at 167.2,-68.9 h10
  text "34" at 167.2,-127.95 h10
  text "32" at 139.64,-175.2 h10
  text "17" at -155.64,-175.2 h10
  text "36" at 167.2,-88.58 h10
  text "21" at -76.9,-175.2 h10
  text "30" at 100.27,-175.2 h10
  text "11" at -183.2,-49.21 h10
  text "16" at -183.2,-147.64 h10
  text "38" at 167.2,-49.21 h10
  text "40" at 167.2,-9.84 h10
  text "27" at 41.21,-175.2 h10
  text "31" at 119.95,-175.2 h10
  text "33" at 167.2,-147.64 h10
  text "18" at -135.95,-175.2 h10
  text "22" at -57.21,-175.2 h10
  text "5" at -179.2,68.9 h10
  text "29" at 80.58,-175.2 h10
  text "6" at -179.2,49.21 h10
  text "24" at -17.84,-175.2 h10
  text "25" at 1.84,-175.2 h10
  text "41" at 167.2,9.84 h10
  text "35" at 167.2,-108.27 h10
  text "13" at -183.2,-88.58 h10
  text "14" at -183.2,-108.27 h10
  text "55" at 21.53,175.2 h10
  text "44" at 167.2,68.9 h10
  text "54" at 41.21,175.2 h10
  text "58" at -37.53,175.2 h10
  text "57" at -17.84,175.2 h10
  text "52" at 80.58,175.2 h10
  text "56" at 1.84,175.2 h10
  text "59" at -57.21,175.2 h10
  text "53" at 60.9,175.2 h10
  text "51" at 100.27,175.2 h10
  text "4" at -179.2,88.58 h10
  text "1" at -179.2,147.64 h10
  text "3" at -179.2,108.27 h10
  text "63" at -135.95,175.2 h10
  text "46" at 167.2,108.27 h10
  text "48" at 167.2,147.64 h10
  text "50" at 119.95,175.2 h10
Mechanical 16:
  drawing of 201 lines, arcs and shapes, not listed
3D body: height 150, standoff 0, extent -190.94,-190.94 190.94,190.94

## LTM4644 [mil] "LTM4644"
pads (77):
  round 25 smd: A1(-150,250) A2(-100,250) A3(-50,250) A4(0,250) A5(50,250) A6(100,250) A7(150,250) B1(-150,200) B2(-100,200) B3(-50,200) B4(0,200) B5(50,200) B6(100,200) B7(150,200) C1(-150,150) C2(-100,150) C3(-50,150) C4(0,150) C5(50,150) C6(100,150) C7(150,150) D1(-150,100) D2(-100,100) D3(-50,100) D4(0,100) D5(50,100) D6(100,100) D7(150,100) E1(-150,50) E2(-100,50) E3(-50,50) E4(0,50) E5(50,50) E6(100,50) E7(150,50) F1(-150,0) F2(-100,0) F3(-50,0) F4(0,0) F5(50,0) F6(100,0) F7(150,0) G1(-150,-50) G2(-100,-50) G3(-50,-50) G4(0,-50) G5(50,-50) G6(100,-50) G7(150,-50) H1(-150,-100) H2(-100,-100) H3(-50,-100) H4(0,-100) H5(50,-100) H6(100,-100) H7(150,-100) J1(-150,-150) J2(-100,-150) J3(-50,-150) J4(0,-150) J5(50,-150) J6(100,-150) J7(150,-150) K1(-150,-200) K2(-100,-200) K3(-50,-200) K4(0,-200) K5(50,-200) K6(100,-200) K7(150,-200) L1(-150,-250) L2(-100,-250) L3(-50,-250) L4(0,-250) L5(50,-250) L6(100,-250) L7(150,-250)
via -125,-175 diameter 18 hole 10
via 125,-125 diameter 18 hole 10
via 25,-175 diameter 18 hole 10
via -125,-25 diameter 18 hole 10
via -75,175 diameter 18 hole 10
via -125,175 diameter 18 hole 10
via 125,225 diameter 18 hole 10
via 25,175 diameter 18 hole 10
via 125,275 diameter 18 hole 10
via 125,125 diameter 18 hole 10
via 125,-75 diameter 18 hole 10
via 175,-125 diameter 18 hole 10
via 175,75 diameter 18 hole 10
via 175,225 diameter 18 hole 10
via 125,-225 diameter 18 hole 10
via 125,75 diameter 18 hole 10
via 25,-25 diameter 18 hole 10
via 175,125 diameter 18 hole 10
via 175,-75 diameter 18 hole 10
via 175,275 diameter 18 hole 10
via 125,175 diameter 18 hole 10
via 125,-25 diameter 18 hole 10
via 125,-175 diameter 18 hole 10
via -125,125 diameter 18 hole 10
via -175,125 diameter 18 hole 10
via -175,-25 diameter 18 hole 10
via -125,-75 diameter 18 hole 10
via -175,-75 diameter 18 hole 10
via -175,275 diameter 18 hole 10
via -175,175 diameter 18 hole 10
via -125,275 diameter 18 hole 10
via -75,275 diameter 18 hole 10
via 75,75 diameter 18 hole 10
via 25,75 diameter 18 hole 10
via -75,75 diameter 18 hole 10
via -75,225 diameter 18 hole 10
via 25,225 diameter 18 hole 10
via 75,225 diameter 18 hole 10
via -75,-125 diameter 18 hole 10
via 75,-125 diameter 18 hole 10
via 25,-125 diameter 18 hole 10
via 75,-275 diameter 18 hole 10
via 25,-275 diameter 18 hole 10
via -75,-275 diameter 18 hole 10
via -175,-175 diameter 18 hole 10
via -175,-225 diameter 18 hole 10
via -125,-225 diameter 18 hole 10
via -175,75 diameter 18 hole 10
via -125,75 diameter 18 hole 10
via -175,225 diameter 18 hole 10
via -125,225 diameter 18 hole 10
via -175,-275 diameter 18 hole 10
via -175,-125 diameter 18 hole 10
via -125,-125 diameter 18 hole 10
via -125,-275 diameter 18 hole 10
via 75,175 diameter 18 hole 10
via 25,275 diameter 18 hole 10
via 75,275 diameter 18 hole 10
via -75,125 diameter 18 hole 10
via 75,125 diameter 18 hole 10
via 25,125 diameter 18 hole 10
via 75,-175 diameter 18 hole 10
via 75,-25 diameter 18 hole 10
via 175,-25 diameter 18 hole 10
via -75,-225 diameter 18 hole 10
via 25,-225 diameter 18 hole 10
via 75,-75 diameter 18 hole 10
via 25,-75 diameter 18 hole 10
via -75,-75 diameter 18 hole 10
Top Layer:
  lines w12: -125,-175 -100,-150 ; -125,-25 -100,0 ; -125,175 -100,150 ; -75,175 -50,150 ; 0,-150 25,-175 ; 0,0 25,-25 ; 0,150 25,175 ; 100,-200 125,-225 ; 100,-150 125,-175 ; 100,-100 125,-125 ; 100,-50 125,-75 ; 100,0 125,-25 ; 100,50 125,75 ; 100,100 125,125 ; 100,150 125,175 ; 100,200 125,225 ; 100,250 125,275 ; 150,-100 175,-125 ; 150,-50 175,-75 ; 150,50 175,75 ; 150,100 175,125 ; 150,200 175,225 ; 150,250 175,275
  lines w15: -175,-275 -150,-250 ; -175,-225 -150,-200 ; -175,-175 -150,-150 ; -175,-125 -150,-100 ; -175,-75 -150,-50 ; -175,-25 -150,0 ; -175,75 -150,50 ; -175,125 -150,100 ; -175,175 -150,150 ; -175,225 -150,200 ; -175,275 -150,250 ; -125,-275 -100,-250 ; -125,-225 -100,-200 ; -125,-125 -100,-100 ; -125,-75 -100,-50 ; -125,75 -100,50 ; -125,125 -100,100 ; -125,225 -100,200 ; -125,275 -100,250 ; -75,-275 -50,-250 ; -75,-225 -50,-200 ; -75,-125 -50,-100 ; -75,-75 -50,-50 ; -75,75 -50,50 ; -75,125 -50,100 ; -75,225 -50,200 ; -75,275 -50,250 ; 0,-250 25,-275 ; 0,-200 25,-225 ; 0,-100 25,-125 ; 0,-50 25,-75 ; 0,50 25,75 ; 0,100 25,125 ; 0,200 25,225 ; 0,250 25,275 ; 50,-250 75,-275 ; 50,-150 75,-175 ; 50,-100 75,-125 ; 50,-50 75,-75 ; 50,0 75,-25 ; 50,50 75,75 ; 50,100 75,125 ; 50,150 75,175 ; 50,200 75,225 ; 50,250 75,275 ; 150,0 175,-25
Top Overlay:
  lines w1.97: -157.48,295.28 -177.17,275.59 -177.17,255.91 ; -177.17,255.91 -137.8,295.28 -177.17,255.91 ; -177.17,-295.28 177.17,-295.28 177.17,295.28 -177.17,295.28 -177.17,-295.28
  lines w9.84: -216.54,300.59 ccw(c-196.85,300.6) -196.85,280.91 ccw(c-196.85,300.59) -177.17,300.59 ccw(c-196.85,300.6) -196.85,320.28 ccw(c-196.85,300.59) -216.54,300.59
Mechanical 5:
  lines w1.97: -157.48,295.28 -177.17,275.59 -177.17,255.91 ; -177.17,255.91 -137.8,295.28 -177.17,255.91 ; -177.17,-295.28 177.17,-295.28 177.17,295.28 -177.17,295.28 -177.17,-295.28
  lines w9.84: -216.54,300.59 cw(c-196.85,300.59) -196.85,320.28 cw(c-196.85,300.6) -177.17,300.59 cw(c-196.85,300.59) -196.85,280.91 cw(c-196.85,300.6) -216.54,300.59
  text "U136" at 195.05,61.31 h25
Mechanical 14:
  text "L6" at 100,-230 h25
  text "K5" at 50,-180 h25
  text "J2" at -100,-130 h25
  text "H6" at 100,-80 h25
  text "J4" at 0,-130 h25
  text "F2" at -100,20 h25
  text "C3" at -50,170 h25
  text "C2" at -100,170 h25
  text "B6" at 100,220 h25
  text "C4" at 0,170 h25
  text "A6" at 100,270 h25
  text "D6" at 100,120 h25
  text "G6" at 100,-30 h25
  text "J7" at 150,-130 h25
  text "K7" at 150,-180 h25
  text "H7" at 150,-80 h25
  text "E7" at 150,70 h25
  text "B7" at 150,220 h25
  text "K6" at 100,-180 h25
  text "E6" at 100,70 h25
  text "F4" at 0,20 h25
  text "D7" at 150,120 h25
  text "G7" at 150,-30 h25
  text "A7" at 150,270 h25
  text "C6" at 100,170 h25
  text "F6" at 100,20 h25
  text "J6" at 100,-130 h25
  text "C7" at 150,170 h25
  text "J3" at -50,-130 h25
  text "L7" at 150,-230 h25
  text "F3" at -50,20 h25
  text "D2" at -100,120 h25
  text "D1" at -150,120 h25
  text "F1" at -150,20 h25
  text "G2" at -100,-30 h25
  text "G1" at -150,-30 h25
  text "A1" at -150,270 h25
  text "C1" at -150,170 h25
  text "A2" at -100,270 h25
  text "A3" at -50,270 h25
  text "E5" at 50,70 h25
  text "E4" at 0,70 h25
  text "E3" at -50,70 h25
  text "B3" at -50,220 h25
  text "B4" at 0,220 h25
  text "B5" at 50,220 h25
  text "H3" at -50,-80 h25
  text "H5" at 50,-80 h25
  text "H4" at 0,-80 h25
  text "L5" at 50,-230 h25
  text "L4" at 0,-230 h25
  text "L3" at -50,-230 h25
  text "J1" at -150,-130 h25
  text "K1" at -150,-180 h25
  text "K2" at -100,-180 h25
  text "E1" at -150,70 h25
  text "E2" at -100,70 h25
  text "B1" at -150,220 h25
  text "B2" at -100,220 h25
  text "L1" at -150,-230 h25
  text "H1" at -150,-80 h25
  text "H2" at -100,-80 h25
  text "L2" at -100,-230 h25
  text "C5" at 50,170 h25
  text "A4" at 0,270 h25
  text "A5" at 50,270 h25
  text "D3" at -50,120 h25
  text "D5" at 50,120 h25
  text "D4" at 0,120 h25
  text "J5" at 50,-130 h25
  text "F5" at 50,20 h25
  text "F7" at 150,20 h25
  text "K3" at -50,-180 h25
  text "K4" at 0,-180 h25
  text "G5" at 50,-30 h25
  text "G4" at 0,-30 h25
  text "G3" at -50,-30 h25
Mechanical 16:
  circle w1.97: c0,0 r13.78
  region: -175,-297.24 179.13,-297.24 179.13,300.2 -175,300.2
  lines w1.97: -19.69,0 19.69,0 ; 0,-19.69 0,19.69
  lines w3.94: -177.17,255.91 -137.8,295.28 ; -177.17,259.84 -141.73,295.28 ; -177.17,263.78 -145.67,295.28 ; -177.17,267.72 -149.61,295.28 ; -177.17,271.65 -153.54,295.28 ; -177.17,275.59 -157.48,295.28 ; -177.17,279.53 -161.42,295.28 ; -177.17,283.46 -165.35,295.28 ; -177.17,287.4 -169.29,295.28 ; -177.17,291.34 -173.23,295.28 ; -177.17,-295.28 -177.17,295.28 177.17,295.28 177.17,-295.28 -177.17,-295.28
Mechanical 17:
  text "LTM4644IY" at 300,190 h25
3D body: height 150, standoff 0, extent -175,-297.24 179.13,300.2